# Altium footprint library ICs And Semiconductors THD.PcbLib: 507 footprints (part 4 of 32)
Each footprint in its own frame and in the unit in brackets; x right, y up, seen from the top. Pads: shape width x height; smd on the part's side, far side on the other; paste and mask are expansions set on the pad; w line width, h text height; cw(c..) or ccw(c..) is an arc to the next point about the centre after c.
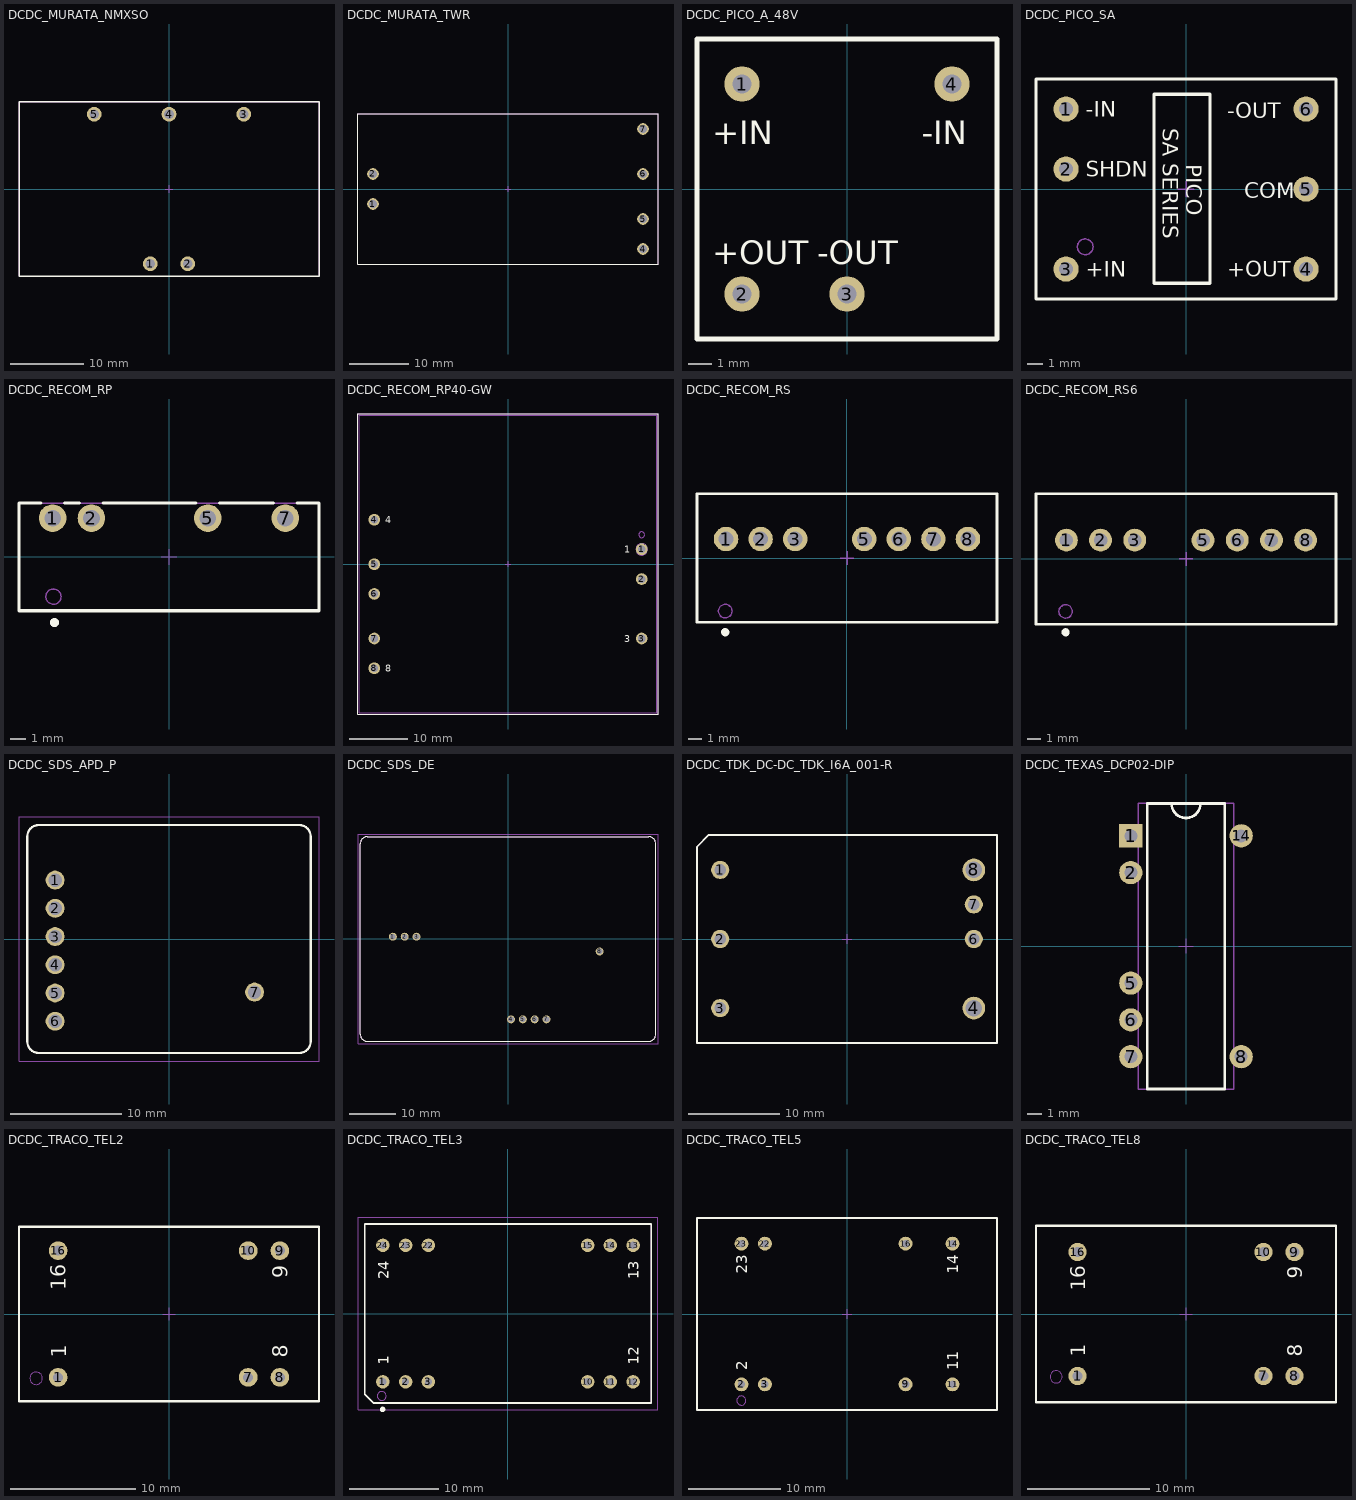
[diagram p3: the footprints below, top view; thin cyan lines are the x and y axes]

## DCDC_MURATA_NMXSO [mm] "NMXSO Series , Body 40.5x23.5mm, Height 10mm"
height 10.25
pads (5):
  round 2 hole 1.3: 1(-2.54,-10.16) 2(2.54,-10.16) 3(10.16,10.16) 4(0,10.16) 5(-10.16,10.16)
Top Overlay:
  lines w0.2: -20.375,-11.875 20.375,-11.875 20.375,11.875 -20.375,11.875 -20.375,-11.875
Notvisible:
  lines w0.1: -10.66,10.16 -10.16,10.16 ; -10.16,9.66 -10.16,10.16 ; -10.16,10.66 -10.16,10.16 ; -9.66,10.16 -10.16,10.16 ; -3.04,-10.16 -2.54,-10.16 ; -2.54,-10.66 -2.54,-10.16 ; -2.54,-9.66 -2.54,-10.16 ; -2.04,-10.16 -2.54,-10.16 ; -0.5,0 0,0 ; -0.5,10.16 0,10.16 ; 0,-0.5 0,0 ; 0,0.5 0,0 ; 0,9.66 0,10.16 ; 0,10.66 0,10.16 ; 0.5,0 0,0 ; 0.5,10.16 0,10.16 ; 2.04,-10.16 2.54,-10.16 ; 2.54,-10.66 2.54,-10.16 ; 2.54,-9.66 2.54,-10.16 ; 3.04,-10.16 2.54,-10.16 ; 9.66,10.16 10.16,10.16 ; 10.16,9.66 10.16,10.16 ; 10.16,10.66 10.16,10.16 ; 10.66,10.16 10.16,10.16
Mechanical 14:
  lines w0.1: -20.375,-11.875 20.375,-11.875 20.375,11.875 -20.375,11.875 -20.375,-11.875
3D body "DCDC_MURATA_NMXSO.stp": height 10.25, standoff -3.5, extent -20.375,-11.875 20.375,11.875

## DCDC_MURATA_TWR [mm] "TWR Series , Body 50.08 x 25.4mm, Height 9.53mm"
height 9.53
pads (6):
  round 2 hole 1.3: 1(-22.86,-2.54) 2(-22.86,2.54) 4(22.86,-10.16) 5(22.86,-5.08) 6(22.86,2.54) 7(22.86,10.16)
Top Overlay:
  lines w0.2: -25.4,-12.7 -25.4,12.7 25.4,12.7 25.4,-12.7 -25.4,-12.7
Notvisible:
  lines w0.1: -23.36,-2.54 -22.86,-2.54 ; -23.36,2.54 -22.86,2.54 ; -22.86,-3.04 -22.86,-2.54 ; -22.86,-2.04 -22.86,-2.54 ; -22.86,2.04 -22.86,2.54 ; -22.86,3.04 -22.86,2.54 ; -22.36,-2.54 -22.86,-2.54 ; -22.36,2.54 -22.86,2.54 ; -0.5,0 0,0 ; 0,-0.5 0,0 ; 0,0.5 0,0 ; 0.5,0 0,0 ; 22.36,-10.16 22.86,-10.16 ; 22.36,-5.08 22.86,-5.08 ; 22.36,2.54 22.86,2.54 ; 22.36,10.16 22.86,10.16 ; 22.86,-10.66 22.86,-10.16 ; 22.86,-9.66 22.86,-10.16 ; 22.86,-5.58 22.86,-5.08 ; 22.86,-4.58 22.86,-5.08 ; 22.86,2.04 22.86,2.54 ; 22.86,3.04 22.86,2.54 ; 22.86,9.66 22.86,10.16 ; 22.86,10.66 22.86,10.16 ; 23.36,-10.16 22.86,-10.16 ; 23.36,-5.08 22.86,-5.08 ; 23.36,2.54 22.86,2.54 ; 23.36,10.16 22.86,10.16
Mechanical 14:
  lines w0.1: -25.4,-12.7 -25.4,12.7 25.4,12.7 25.4,-12.7 -25.4,-12.7
3D body "DC-DC_MURATA_TWR.stp": height 9.53, standoff -3.8, extent -25.4,-12.7 25.4,12.7

## DCDC_PICO_A_48V [mm] "A Series , Body 12.7x12.7mm, Pitch 4.45mm"
height 7.62
pads (4):
  round 1.5 hole 0.8: 1(-4.445,4.445) 2(-4.445,-4.445) 3(0,-4.445) 4(4.445,4.445)
Top Overlay:
  lines w0.2: -6.35,-6.35 6.35,-6.35 6.35,6.35 -6.35,6.35 -6.35,-6.35
  text "-OUT" at -1.27,-3.175 h1
  text "-IN" at 3.175,1.905 h1
  text "+IN" at -5.715,1.905 h1
  text "+OUT" at -5.715,-3.175 h1
Notvisible:
  lines w0.1: -4.945,-4.445 -4.445,-4.445 ; -4.945,4.445 -4.445,4.445 ; -4.445,-4.945 -4.445,-4.445 ; -4.445,-3.945 -4.445,-4.445 ; -4.445,3.945 -4.445,4.445 ; -4.445,4.945 -4.445,4.445 ; -3.945,-4.445 -4.445,-4.445 ; -3.945,4.445 -4.445,4.445 ; -0.5,-4.445 0,-4.445 ; 0,-4.945 0,-4.445 ; 0,-3.945 0,-4.445 ; 0.5,-4.445 0,-4.445 ; 3.945,4.445 4.445,4.445 ; 4.445,3.945 4.445,4.445 ; 4.445,4.945 4.445,4.445 ; 4.945,4.445 4.445,4.445
Mechanical 14:
  lines w0.1: -6.35,-6.35 -6.35,6.35 6.35,6.35 6.35,-6.35 -6.35,-6.35
3D body "DCDC_PICO_A_48V.stp": height 7.62, standoff -3.8, extent -6.35,-6.35 6.35,6.35

## DCDC_PICO_SA [mm] "SA Series THD , Body 19.05x13.97mm, Pitch 5.08/15.24mm"
height 10.16
pads (6):
  round 1.6 hole 0.9: 1(-7.62,5.08) 2(-7.62,1.27) 3(-7.62,-5.08) 4(7.62,-5.08) 5(7.62,0) 6(7.62,5.08)
Top Overlay:
  lines w0.2: -9.53,-6.98 -9.53,6.99 9.52,6.99 9.52,-6.98 -9.53,-6.98 ; -2.032,-5.98 1.52,-5.98 1.52,6.02 -2.032,6.02 -2.032,-5.98
  text "SA SERIES" at -1.48,3.87 h1
  text "PICO" at 0.02,1.59 h1
  text "COM" at 3.683,-0.58 h1
  text "SHDN" at -6.366,0.77 h1
  text "+OUT" at 2.62,-5.58 h1
  text "+IN" at -6.366,-5.58 h1
  text "-OUT" at 2.62,4.5 h1
  text "-IN" at -6.366,4.58 h1
Notvisible:
  lines w0.1: -8.12,-5.08 -7.62,-5.08 ; -8.12,1.27 -7.62,1.27 ; -8.12,5.08 -7.62,5.08 ; -7.62,-5.58 -7.62,-5.08 ; -7.62,-4.58 -7.62,-5.08 ; -7.62,0.77 -7.62,1.27 ; -7.62,1.77 -7.62,1.27 ; -7.62,4.58 -7.62,5.08 ; -7.62,5.58 -7.62,5.08 ; -7.12,-5.08 -7.62,-5.08 ; -7.12,1.27 -7.62,1.27 ; -7.12,5.08 -7.62,5.08 ; -0.5,0 0,0 ; 0,-0.5 0,0 ; 0,0.5 0,0 ; 0.5,0 0,0 ; 7.12,-5.08 7.62,-5.08 ; 7.12,0 7.62,0 ; 7.12,5.08 7.62,5.08 ; 7.62,-5.58 7.62,-5.08 ; 7.62,-4.58 7.62,-5.08 ; 7.62,-0.5 7.62,0 ; 7.62,0.5 7.62,0 ; 7.62,4.58 7.62,5.08 ; 7.62,5.58 7.62,5.08 ; 8.12,-5.08 7.62,-5.08 ; 8.12,0 7.62,0 ; 8.12,5.08 7.62,5.08
Mechanical 14:
  circle w0.1: c-6.407,-3.667 r0.5
  lines w0.1: -9.53,-6.975 9.52,-6.975 9.52,6.975 -9.53,6.975 -9.53,-6.975
3D body "DCDC_PICO_SA.stp": height 10.16, standoff -5.08, extent -9.525,-6.985 9.525,6.985

## DCDC_RECOM_RP [mm] "RS Series , Body 19.65x7.05mm, Compact SIP-7 Package"
height 10.2
pads (4):
  round 1.8 hole 1.1: 1(-7.62,2.54) 2(-5.08,2.54) 5(2.54,2.54) 7(7.62,2.54)
Top Overlay:
  circle w0.3: c-7.5,-4.3 r0.15
  lines w0.2: -8.39,3.525 -9.825,3.525 -9.825,-3.525 9.825,-3.525 9.825,3.525 8.39,3.525 ; -6.85,3.525 -5.85,3.525 ; -4.31,3.525 1.77,3.525 ; 3.31,3.525 6.85,3.525
Notvisible:
  lines w0.05: -8.12,2.54 -7.62,2.54 ; -7.62,2.04 -7.62,2.54 ; -7.62,3.04 -7.62,2.54 ; -7.12,2.54 -7.62,2.54 ; -5.58,2.54 -5.08,2.54 ; -5.08,2.04 -5.08,2.54 ; -5.08,3.04 -5.08,2.54 ; -4.58,2.54 -5.08,2.54 ; -0.5,0 0,0 ; 0,-0.5 0,0 ; 0,0.5 0,0 ; 0.5,0 0,0 ; 2.04,2.54 2.54,2.54 ; 2.54,2.04 2.54,2.54 ; 2.54,3.04 2.54,2.54 ; 3.04,2.54 2.54,2.54 ; 7.12,2.54 7.62,2.54 ; 7.62,2.04 7.62,2.54 ; 7.62,3.04 7.62,2.54 ; 8.12,2.54 7.62,2.54
Mechanical 14:
  circle w0.1: c-7.57,-2.6 r0.5
  lines w0.1: -9.825,-3.525 -9.825,3.525 9.825,3.525 9.825,-3.525 -9.825,-3.525
3D body "DCDC_RECOM_RP.stp": height 10.1, standoff -4.1, extent -9.82,-3.525 9.83,3.525

## DCDC_RECOM_RP40-GW [mm] "RP40-GW Series, Body L 50.8 x W 50.8 x H 10.7mm"
height 10.7
pads (8):
  round 2 hole 1.3: 1(22.86,2.5) 2(22.86,-2.58) 3(22.86,-12.74) 4(-22.86,7.58) 5(-22.86,-0.04) 6(-22.86,-5.12) 7(-22.86,-12.74) 8(-22.86,-17.82)
Top Overlay:
  lines w0.2: -25.65,-25.65 -25.65,25.65 25.65,25.65 25.65,-25.65 -25.65,-25.65
  text "1" at 19.885,1.89 h1.2
  text "3" at 19.885,-13.35 h1.2
  text "8" at -20.975,-18.43 h1.2
  text "4" at -20.975,6.97 h1.2
Notvisible:
  circle w0.1: c22.86,2.5 r0.65
  circle w0.1: c22.86,2.5 r1
  lines w0.1: -23.36,-17.82 -22.86,-17.82 ; -23.36,-12.74 -22.86,-12.74 ; -23.36,-5.12 -22.86,-5.12 ; -23.36,-0.04 -22.86,-0.04 ; -23.36,7.58 -22.86,7.58 ; -22.86,-18.32 -22.86,-17.82 ; -22.86,-17.32 -22.86,-17.82 ; -22.86,-13.24 -22.86,-12.74 ; -22.86,-12.24 -22.86,-12.74 ; -22.86,-5.62 -22.86,-5.12 ; -22.86,-4.62 -22.86,-5.12 ; -22.86,-0.54 -22.86,-0.04 ; -22.86,0.46 -22.86,-0.04 ; -22.86,7.08 -22.86,7.58 ; -22.86,8.08 -22.86,7.58 ; -22.36,-17.82 -22.86,-17.82 ; -22.36,-12.74 -22.86,-12.74 ; -22.36,-5.12 -22.86,-5.12 ; -22.36,-0.04 -22.86,-0.04 ; -22.36,7.58 -22.86,7.58 ; -0.5,0 0,0 ; 0,-0.5 0,0 ; 0,0.5 0,0 ; 0.5,0 0,0 ; 22.36,-12.74 22.86,-12.74 ; 22.36,-2.58 22.86,-2.58 ; 22.36,2.5 22.86,2.5 ; 22.86,-13.24 22.86,-12.74 ; 22.86,-12.24 22.86,-12.74 ; 22.86,-3.08 22.86,-2.58 ; 22.86,-2.08 22.86,-2.58 ; 22.86,2 22.86,2.5 ; 22.86,3 22.86,2.5 ; 23.36,-12.74 22.86,-12.74 ; 23.36,-2.58 22.86,-2.58 ; 23.36,2.5 22.86,2.5 ; -25.4,-25.4 25.4,-25.4 25.4,25.4 -25.4,25.4 -25.4,-25.4
Mechanical 14:
  lines w0.1: 23.354,5.076 ccw(c22.86,5) 23.36,5 ; -25.65,-25.65 -25.65,25.65 25.65,25.65 25.65,-25.65 -25.65,-25.65
  text "1" at 19.685,1.69 h1.2
  text "3" at 19.685,-13.55 h1.2
  text "8" at -21.175,-18.63 h1.2
  text "4" at -21.175,6.77 h1.2
3D body "DCDC_RECOM_RP40-GW.stp": height 10.8, standoff -3.6, extent -25.65,-25.65 25.65,25.65

## DCDC_RECOM_RS [mm] "RS Series , Body 21.8x9.2mm, Compact SIP-8 Package"
height 11.35
pads (7):
  round 1.8 hole 1.1: 1(-8.89,1.4) 2(-6.35,1.4) 3(-3.81,1.4) 5(1.27,1.4) 6(3.81,1.4) 7(6.35,1.4) 8(8.89,1.4)
Top Overlay:
  circle w0.3: c-8.95,-5.45 r0.15
  lines w0.2: -11.025,-4.725 -11.025,4.725 11.025,4.725 11.025,-4.725 -11.025,-4.725
Notvisible:
  lines w0.1: -9.39,1.4 -8.89,1.4 ; -8.89,0.9 -8.89,1.4 ; -8.89,1.9 -8.89,1.4 ; -8.39,1.4 -8.89,1.4 ; -6.85,1.4 -6.35,1.4 ; -6.35,0.9 -6.35,1.4 ; -6.35,1.9 -6.35,1.4 ; -5.85,1.4 -6.35,1.4 ; -4.31,1.4 -3.81,1.4 ; -3.81,0.9 -3.81,1.4 ; -3.81,1.9 -3.81,1.4 ; -3.31,1.4 -3.81,1.4 ; -0.5,0 0,0 ; 0,-0.5 0,0 ; 0,0.5 0,0 ; 0.5,0 0,0 ; 0.77,1.4 1.27,1.4 ; 1.27,0.9 1.27,1.4 ; 1.27,1.9 1.27,1.4 ; 1.77,1.4 1.27,1.4 ; 3.31,1.4 3.81,1.4 ; 3.81,0.9 3.81,1.4 ; 3.81,1.9 3.81,1.4 ; 4.31,1.4 3.81,1.4 ; 5.85,1.4 6.35,1.4 ; 6.35,0.9 6.35,1.4 ; 6.35,1.9 6.35,1.4 ; 6.85,1.4 6.35,1.4 ; 8.39,1.4 8.89,1.4 ; 8.89,0.9 8.89,1.4 ; 8.89,1.9 8.89,1.4 ; 9.39,1.4 8.89,1.4
Mechanical 14:
  circle w0.1: c-8.95,-3.9 r0.5
  lines w0.1: -11.025,-4.725 -11.025,4.725 11.025,4.725 11.025,-4.725 -11.025,-4.725
3D body "DCDC_RECOM_RS.stp": height 11.35, standoff -3.6, extent -11.025,-4.725 11.025,4.725

## DCDC_RECOM_RS6 [mm] "RS6 Series , Body 21.8x9.2mm, Compact SIP-8 Package"
height 11.6
pads (7):
  round 1.7 hole 1: 1(-8.89,1.4) 2(-6.35,1.4) 3(-3.81,1.4) 5(1.27,1.4) 6(3.81,1.4) 7(6.35,1.4) 8(8.89,1.4)
Top Overlay:
  circle w0.3: c-8.95,-5.45 r0.15
  lines w0.2: -11.15,-4.85 -11.15,4.85 11.15,4.85 11.15,-4.85 -11.15,-4.85
Notvisible:
  lines w0.1: -9.39,1.4 -8.89,1.4 ; -8.89,0.9 -8.89,1.4 ; -8.89,1.9 -8.89,1.4 ; -8.39,1.4 -8.89,1.4 ; -6.85,1.4 -6.35,1.4 ; -6.35,0.9 -6.35,1.4 ; -6.35,1.9 -6.35,1.4 ; -5.85,1.4 -6.35,1.4 ; -4.31,1.4 -3.81,1.4 ; -3.81,0.9 -3.81,1.4 ; -3.81,1.9 -3.81,1.4 ; -3.31,1.4 -3.81,1.4 ; -0.5,0 0,0 ; 0,-0.5 0,0 ; 0,0.5 0,0 ; 0.5,0 0,0 ; 0.77,1.4 1.27,1.4 ; 1.27,0.9 1.27,1.4 ; 1.27,1.9 1.27,1.4 ; 1.77,1.4 1.27,1.4 ; 3.31,1.4 3.81,1.4 ; 3.81,0.9 3.81,1.4 ; 3.81,1.9 3.81,1.4 ; 4.31,1.4 3.81,1.4 ; 5.85,1.4 6.35,1.4 ; 6.35,0.9 6.35,1.4 ; 6.35,1.9 6.35,1.4 ; 6.85,1.4 6.35,1.4 ; 8.39,1.4 8.89,1.4 ; 8.89,0.9 8.89,1.4 ; 8.89,1.9 8.89,1.4 ; 9.39,1.4 8.89,1.4
Mechanical 14:
  circle w0.1: c-8.95,-3.9 r0.5
  lines w0.1: -11.15,-4.85 -11.15,4.85 11.15,4.85 11.15,-4.85 -11.15,-4.85
3D body "DCDC_RECOM_RS6.stp": height 11.6, standoff -3.6, extent -11.15,-4.85 11.15,4.85

## DCDC_SDS_APD_P [mm] "ADP Series , Body 25.5x20.5mm, high voltage DC-DC converter"
height 11
pads (7):
  round 1.7 hole 1.2: 1(-10.25,5.3) 2(-10.25,2.76) 3(-10.25,0.22) 4(-10.25,-2.32) 5(-10.25,-4.86) 6(-10.25,-7.4) 7(7.7,-4.78)
Top Overlay:
  lines w0.2: -12.75,-9.25 ccw(c-11.75,-9.25) -11.75,-10.25 11.75,-10.25 ccw(c11.75,-9.25) 12.75,-9.25 12.75,9.25 ccw(c11.75,9.25) 11.75,10.25 -11.75,10.25 ccw(c-11.75,9.25) -12.75,9.25 -12.75,-9.25
Mechanical 14:
  lines w0.1: -12.75,-9.25 ccw(c-11.75,-9.25) -11.75,-10.25 11.75,-10.25 ccw(c11.75,-9.25) 12.75,-9.25 12.75,9.25 ccw(c11.75,9.25) 11.75,10.25 -11.75,10.25 ccw(c-11.75,9.25) -12.75,9.25 -12.75,-9.25
Mechanical 15:
  lines w0.05: -13.5,-11 -13.5,11 13.5,11 13.5,-11 -13.5,-11
3D body "DCDC_SDS_APD_P.stp": height 11, standoff -3.6, extent -12.75,-10.25 12.75,10.25

## DCDC_SDS_DE [mm] "DE Series , Body 63.5x44mm, high voltage DC-DC converter"
height 17.5
pads (8):
  round 1.7 hole 1.2: 1(-24.75,0.5) 2(-22.21,0.5) 3(-19.67,0.5) 4(0.65,-17.28) 5(3.19,-17.28) 6(5.73,-17.28) 7(8.27,-17.28) 8(19.7,-2.675)
Top Overlay:
  lines w0.2: -31.75,-20.5 ccw(c-30.25,-20.5) -30.25,-22 30.25,-22 ccw(c30.25,-20.5) 31.75,-20.5 31.75,20.5 ccw(c30.25,20.5) 30.25,22 -30.25,22 ccw(c-30.25,20.5) -31.75,20.5 -31.75,-20.5
Mechanical 14:
  lines w0.1: -31.75,-20.5 ccw(c-30.25,-20.5) -30.25,-22 30.25,-22 ccw(c30.25,-20.5) 31.75,-20.5 31.75,20.5 ccw(c30.25,20.5) 30.25,22 -30.25,22 ccw(c-30.25,20.5) -31.75,20.5 -31.75,-20.5
Mechanical 15:
  lines w0.05: -32.25,-22.5 32.25,-22.5 32.25,22.5 -32.25,22.5 -32.25,-22.5
3D body "DCDC_SDS_DE.stp": height 17.5, standoff -3.6, extent -31.75,-22 31.75,22

## DCDC_TDK_DC-DC_TDK_I6A_001-R [mm] "TDK, i6A Series, 250W, 9-40V Input, 3.3 to 24V Output, Non-isolated DC-DC Converter (Negative Logic ON/OFF Option)"
height 12.1
pads (7):
  round 2 hole 1.3: 1(-13.95,7.6) 2(-13.95,0) 3(-13.95,-7.6) 6(13.95,0) 7(13.95,3.8)
  round 2.5 hole 1.8: 4(13.95,-7.6) 8(13.95,7.6)
Top Overlay:
  lines w0.2: -16.5,-11.45 16.5,-11.45 16.5,11.45 -15.2,11.45 -16.5,10.15 -16.5,-11.45
Notvisible:
  lines w0.1: -14.45,-7.6 -13.95,-7.6 ; -14.45,0 -13.95,0 ; -14.45,7.6 -13.95,7.6 ; -13.95,-8.1 -13.95,-7.6 ; -13.95,-7.1 -13.95,-7.6 ; -13.95,-0.5 -13.95,0 ; -13.95,0.5 -13.95,0 ; -13.95,7.1 -13.95,7.6 ; -13.95,8.1 -13.95,7.6 ; -13.45,-7.6 -13.95,-7.6 ; -13.45,0 -13.95,0 ; -13.45,7.6 -13.95,7.6 ; -0.5,0 0,0 ; 0,-0.5 0,0 ; 0,0.5 0,0 ; 0.5,0 0,0 ; 13.45,-7.6 13.95,-7.6 ; 13.45,0 13.95,0 ; 13.45,3.8 13.95,3.8 ; 13.45,7.6 13.95,7.6 ; 13.95,-8.1 13.95,-7.6 ; 13.95,-7.1 13.95,-7.6 ; 13.95,-0.5 13.95,0 ; 13.95,0.5 13.95,0 ; 13.95,3.3 13.95,3.8 ; 13.95,4.3 13.95,3.8 ; 13.95,7.1 13.95,7.6 ; 13.95,8.1 13.95,7.6 ; 14.45,-7.6 13.95,-7.6 ; 14.45,0 13.95,0 ; 14.45,3.8 13.95,3.8 ; 14.45,7.6 13.95,7.6
Mechanical 14:
  lines w0.1: -16.5,-11.45 16.5,-11.45 ; -16.5,-11.45 -16.5,10.15 ; -16.5,-11.45 16.5,-11.45 ; -16.5,-11.45 -16.5,10.15 ; -16.5,10.15 -15.2,11.45 ; -16.5,10.15 -15.2,11.45 ; -15.2,11.45 16.5,11.45 ; -15.2,11.45 16.5,11.45 ; 16.5,-11.45 16.5,11.45 ; 16.5,-11.45 16.5,11.45
3D body "DC-DC_TDK_I6A_001-R.stp": height 11.96, standoff -3.7, extent -16.5,-11.45 16.5,11.45

## DCDC_TEXAS_DCP02-DIP [mm] "DIP; 14 - 7 Leads, Row Spacing 7.62 mm; Pitch 2.54 mm"
height 5.33
pads (7):
  rect 1.6x1.6 hole 0.9: 1(-3.81,7.62)
  round 1.6 hole 0.9: 2(-3.81,5.08) 5(-3.81,-2.54) 6(-3.81,-5.08) 7(-3.81,-7.62) 8(3.81,-7.62) 14(3.81,7.62)
Top Overlay:
  lines w0.2: -0.999,9.85 ccw(c0,9.85) 0.999,9.85 ; -2.675,-9.85 -2.675,9.85 2.675,9.85 2.675,-9.85 -2.675,-9.85
Notvisible:
  lines w0.05: -4.31,-7.62 -3.81,-7.62 ; -4.31,-5.08 -3.81,-5.08 ; -4.31,-2.54 -3.81,-2.54 ; -4.31,5.08 -3.81,5.08 ; -4.31,7.62 -3.81,7.62 ; -3.81,-8.12 -3.81,-7.62 ; -3.81,-7.12 -3.81,-7.62 ; -3.81,-5.58 -3.81,-5.08 ; -3.81,-4.58 -3.81,-5.08 ; -3.81,-3.04 -3.81,-2.54 ; -3.81,-2.04 -3.81,-2.54 ; -3.81,4.58 -3.81,5.08 ; -3.81,5.58 -3.81,5.08 ; -3.81,7.12 -3.81,7.62 ; -3.81,8.12 -3.81,7.62 ; -3.31,-7.62 -3.81,-7.62 ; -3.31,-5.08 -3.81,-5.08 ; -3.31,-2.54 -3.81,-2.54 ; -3.31,5.08 -3.81,5.08 ; -3.31,7.62 -3.81,7.62 ; -0.5,0 0,0 ; 0,-0.5 0,0 ; 0,0.5 0,0 ; 0.5,0 0,0 ; 3.31,-7.62 3.81,-7.62 ; 3.31,7.62 3.81,7.62 ; 3.81,-8.12 3.81,-7.62 ; 3.81,-7.12 3.81,-7.62 ; 3.81,7.12 3.81,7.62 ; 3.81,8.12 3.81,7.62 ; 4.31,-7.62 3.81,-7.62 ; 4.31,7.62 3.81,7.62
Mechanical 14:
  lines w0.1: -0.999,9.85 ccw(c0,9.85) 0.999,9.85 ; -3.3,-9.85 -3.3,9.85 3.3,9.85 3.3,-9.85 -3.3,-9.85
3D body "DCDC_TEXAS_DCP02-DIP.stp": height 5.33, standoff -3.3, extent -3.935,-9.851 3.935,9.851

## DCDC_TRACO_TEL2 [mm] "TEL2 Series , Body 23.8x13.7mm, Pitch 2.54mm"
height 7.87
pads (6):
  round 1.5 hole 0.8: 1(-8.89,-5.08) 7(6.35,-5.08) 8(8.89,-5.08) 9(8.89,5.08) 10(6.35,5.08) 16(-8.89,5.08)
Top Overlay:
  lines w0.2: -12.025,-6.975 12.025,-6.975 12.025,6.975 -12.025,6.975 -12.025,-6.975
  text "1" at -8.255,-3.5 h1.2
  text "16" at -8.28,1.895 h1.2
  text "9" at 9.525,2.87 h1.2
  text "8" at 9.525,-3.5 h1.2
Notvisible:
  lines w0.1: -9.39,-5.08 -8.89,-5.08 ; -9.39,5.08 -8.89,5.08 ; -8.89,-5.58 -8.89,-5.08 ; -8.89,-4.58 -8.89,-5.08 ; -8.89,4.58 -8.89,5.08 ; -8.89,5.58 -8.89,5.08 ; -8.39,-5.08 -8.89,-5.08 ; -8.39,5.08 -8.89,5.08 ; -0.5,0 0,0 ; 0,-0.5 0,0 ; 0,0.5 0,0 ; 0.5,0 0,0 ; 5.85,-5.08 6.35,-5.08 ; 5.85,5.08 6.35,5.08 ; 6.35,-5.58 6.35,-5.08 ; 6.35,-4.58 6.35,-5.08 ; 6.35,4.58 6.35,5.08 ; 6.35,5.58 6.35,5.08 ; 6.85,-5.08 6.35,-5.08 ; 6.85,5.08 6.35,5.08 ; 8.39,-5.08 8.89,-5.08 ; 8.39,5.08 8.89,5.08 ; 8.89,-5.58 8.89,-5.08 ; 8.89,-4.58 8.89,-5.08 ; 8.89,4.58 8.89,5.08 ; 8.89,5.58 8.89,5.08 ; 9.39,-5.08 8.89,-5.08 ; 9.39,5.08 8.89,5.08
Mechanical 14:
  circle w0.1: c-10.65,-5.155 r0.5
  lines w0.1: -12.025,-6.975 12.025,-6.975 12.025,6.975 -12.025,6.975 -12.025,-6.975
  text "1" at -8.255,-3.5 h1.2
  text "16" at -8.28,1.895 h1.2
  text "9" at 9.525,2.87 h1.2
  text "8" at 9.525,-3.5 h1.2
3D body "DCDC_TRACO_TEL2.stp": height 7.87, standoff -3.2, extent -12.025,-6.975 12.025,6.975

## DCDC_TRACO_TEL3 [mm] "TEL3 Series , Body 32x20mm, Pitch 2.54mm"
height 10.7
pads (12):
  round 1.5 hole 0.8: 1(-13.97,-7.62) 2(-11.43,-7.62) 3(-8.89,-7.62) 10(8.89,-7.62) 11(11.43,-7.62) 12(13.97,-7.62) 13(13.97,7.62) 14(11.43,7.62) 15(8.89,7.62) 22(-8.89,7.62) 23(-11.43,7.62) 24(-13.97,7.62)
Top Overlay:
  circle w0.3: c-14,-10.7 r0.15
  lines w0.2: -16,-9 -16,10 16,10 16,-10 -15,-10 -16,-9
  text "1" at -13.335,-5.715 h1.2
  text "13" at 14.605,3.81 h1.2
  text "24" at -13.335,3.81 h1.2
  text "12" at 14.605,-5.715 h1.2
Mechanical 14:
  circle w0.1: c-14.095,-9.205 r0.5
  lines w0.1: -16,-9 -16,10 16,10 16,-10 -15,-10 -16,-9
  text "1" at -13.335,-5.715 h1.2
  text "12" at 14.605,-5.715 h1.2
  text "13" at 14.605,3.81 h1.2
  text "24" at -13.335,3.81 h1.2
Mechanical 15:
  lines w0.05: -16.75,-10.75 16.75,-10.75 16.75,10.75 -16.75,10.75 -16.75,-10.75
3D body "DCDC_TRACO_TEL3.stp": height 10.7, standoff -3.8, extent -16,-10 16,10

## DCDC_TRACO_TEL5 [mm] "TEL5 Series , Body 32x20.3mm, Pitch 2.54mm"
height 10.7
pads (8):
  round 1.5 hole 0.8: 2(-11.43,-7.62) 3(-8.89,-7.62) 9(6.35,-7.62) 11(11.43,-7.62) 14(11.43,7.62) 16(6.35,7.62) 22(-8.89,7.62) 23(-11.43,7.62)
Top Overlay:
  lines w0.2: -16.25,-10.4 -16.25,10.4 16.25,10.4 16.25,-10.4 -16.25,-10.4
  text "2" at -10.82,-6.09 h1.2
  text "14" at 12.065,4.335 h1.2
  text "23" at -10.795,4.335 h1.2
  text "11" at 12.04,-6.09 h1.2
Notvisible:
  lines w0.1: -11.93,-7.62 -11.43,-7.62 ; -11.93,7.62 -11.43,7.62 ; -11.43,-8.12 -11.43,-7.62 ; -11.43,-7.12 -11.43,-7.62 ; -11.43,7.12 -11.43,7.62 ; -11.43,8.12 -11.43,7.62 ; -10.93,-7.62 -11.43,-7.62 ; -10.93,7.62 -11.43,7.62 ; -9.39,-7.62 -8.89,-7.62 ; -9.39,7.62 -8.89,7.62 ; -8.89,-8.12 -8.89,-7.62 ; -8.89,-7.12 -8.89,-7.62 ; -8.89,7.12 -8.89,7.62 ; -8.89,8.12 -8.89,7.62 ; -8.39,-7.62 -8.89,-7.62 ; -8.39,7.62 -8.89,7.62 ; -0.5,0 0,0 ; 0,-0.5 0,0 ; 0,0.5 0,0 ; 0.5,0 0,0 ; 5.85,-7.62 6.35,-7.62 ; 5.85,7.62 6.35,7.62 ; 6.35,-8.12 6.35,-7.62 ; 6.35,-7.12 6.35,-7.62 ; 6.35,7.12 6.35,7.62 ; 6.35,8.12 6.35,7.62 ; 6.85,-7.62 6.35,-7.62 ; 6.85,7.62 6.35,7.62 ; 10.93,-7.62 11.43,-7.62 ; 10.93,7.62 11.43,7.62 ; 11.43,-8.12 11.43,-7.62 ; 11.43,-7.12 11.43,-7.62 ; 11.43,7.12 11.43,7.62 ; 11.43,8.12 11.43,7.62 ; 11.93,-7.62 11.43,-7.62 ; 11.93,7.62 11.43,7.62
Mechanical 14:
  circle w0.1: c-11.445,-9.38 r0.5
  lines w0.1: -16.25,-10.4 -16.25,10.4 16.25,10.4 16.25,-10.4 -16.25,-10.4
  text "2" at -10.82,-6.09 h1.2
  text "11" at 12.04,-6.09 h1.2
  text "14" at 12.065,4.335 h1.2
  text "23" at -10.795,4.335 h1.2
3D body "DCDC_TRACO_TEL5.stp": height 10.7, standoff -3.6, extent -16.25,-10.4 16.25,10.4

## DCDC_TRACO_TEL8 [mm] "TEL8 Series , Body 24.1x14mm, Pitch 2.54mm"
height 9
pads (6):
  round 1.5 hole 0.8: 1(-8.89,-5.08) 7(6.35,-5.08) 8(8.89,-5.08) 9(8.89,5.08) 10(6.35,5.08) 16(-8.89,5.08)
Top Overlay:
  lines w0.2: -12.3,-7.25 -12.3,7.25 12.3,7.25 12.3,-7.25 -12.3,-7.25
  text "8" at 9.525,-3.5 h1.2
  text "9" at 9.525,2.87 h1.2
  text "16" at -8.28,1.895 h1.2
  text "1" at -8.255,-3.5 h1.2
Notvisible:
  lines w0.1: -9.39,-5.08 -8.89,-5.08 ; -9.39,5.08 -8.89,5.08 ; -8.89,-5.58 -8.89,-5.08 ; -8.89,-4.58 -8.89,-5.08 ; -8.89,4.58 -8.89,5.08 ; -8.89,5.58 -8.89,5.08 ; -8.39,-5.08 -8.89,-5.08 ; -8.39,5.08 -8.89,5.08 ; -0.5,0 0,0 ; 0,-0.5 0,0 ; 0,0.5 0,0 ; 0.5,0 0,0 ; 5.85,-5.08 6.35,-5.08 ; 5.85,5.08 6.35,5.08 ; 6.35,-5.58 6.35,-5.08 ; 6.35,-4.58 6.35,-5.08 ; 6.35,4.58 6.35,5.08 ; 6.35,5.58 6.35,5.08 ; 6.85,-5.08 6.35,-5.08 ; 6.85,5.08 6.35,5.08 ; 8.39,-5.08 8.89,-5.08 ; 8.39,5.08 8.89,5.08 ; 8.89,-5.58 8.89,-5.08 ; 8.89,-4.58 8.89,-5.08 ; 8.89,4.58 8.89,5.08 ; 8.89,5.58 8.89,5.08 ; 9.39,-5.08 8.89,-5.08 ; 9.39,5.08 8.89,5.08
Mechanical 14:
  circle w0.1: c-10.65,-5.155 r0.5
  lines w0.1: -12.3,-7.25 12.3,-7.25 12.3,7.25 -12.3,7.25 -12.3,-7.25
  text "8" at 9.525,-3.5 h1.2
  text "9" at 9.525,2.87 h1.2
  text "16" at -8.28,1.895 h1.2
  text "1" at -8.255,-3.5 h1.2
3D body "DCDC_TRACO_TEL8.stp": height 9, standoff -3.2, extent -12.3,-7.25 12.3,7.25